# Altium footprint library 常用连接件.PcbLib: 38 footprints (part 1 of 3)
Each footprint in its own frame and in the unit in brackets; x right, y up, seen from the top. Pads: shape width x height; smd on the part's side, far side on the other; paste and mask are expansions set on the pad; w line width, h text height; cw(c..) or ccw(c..) is an arc to the next point about the centre after c.
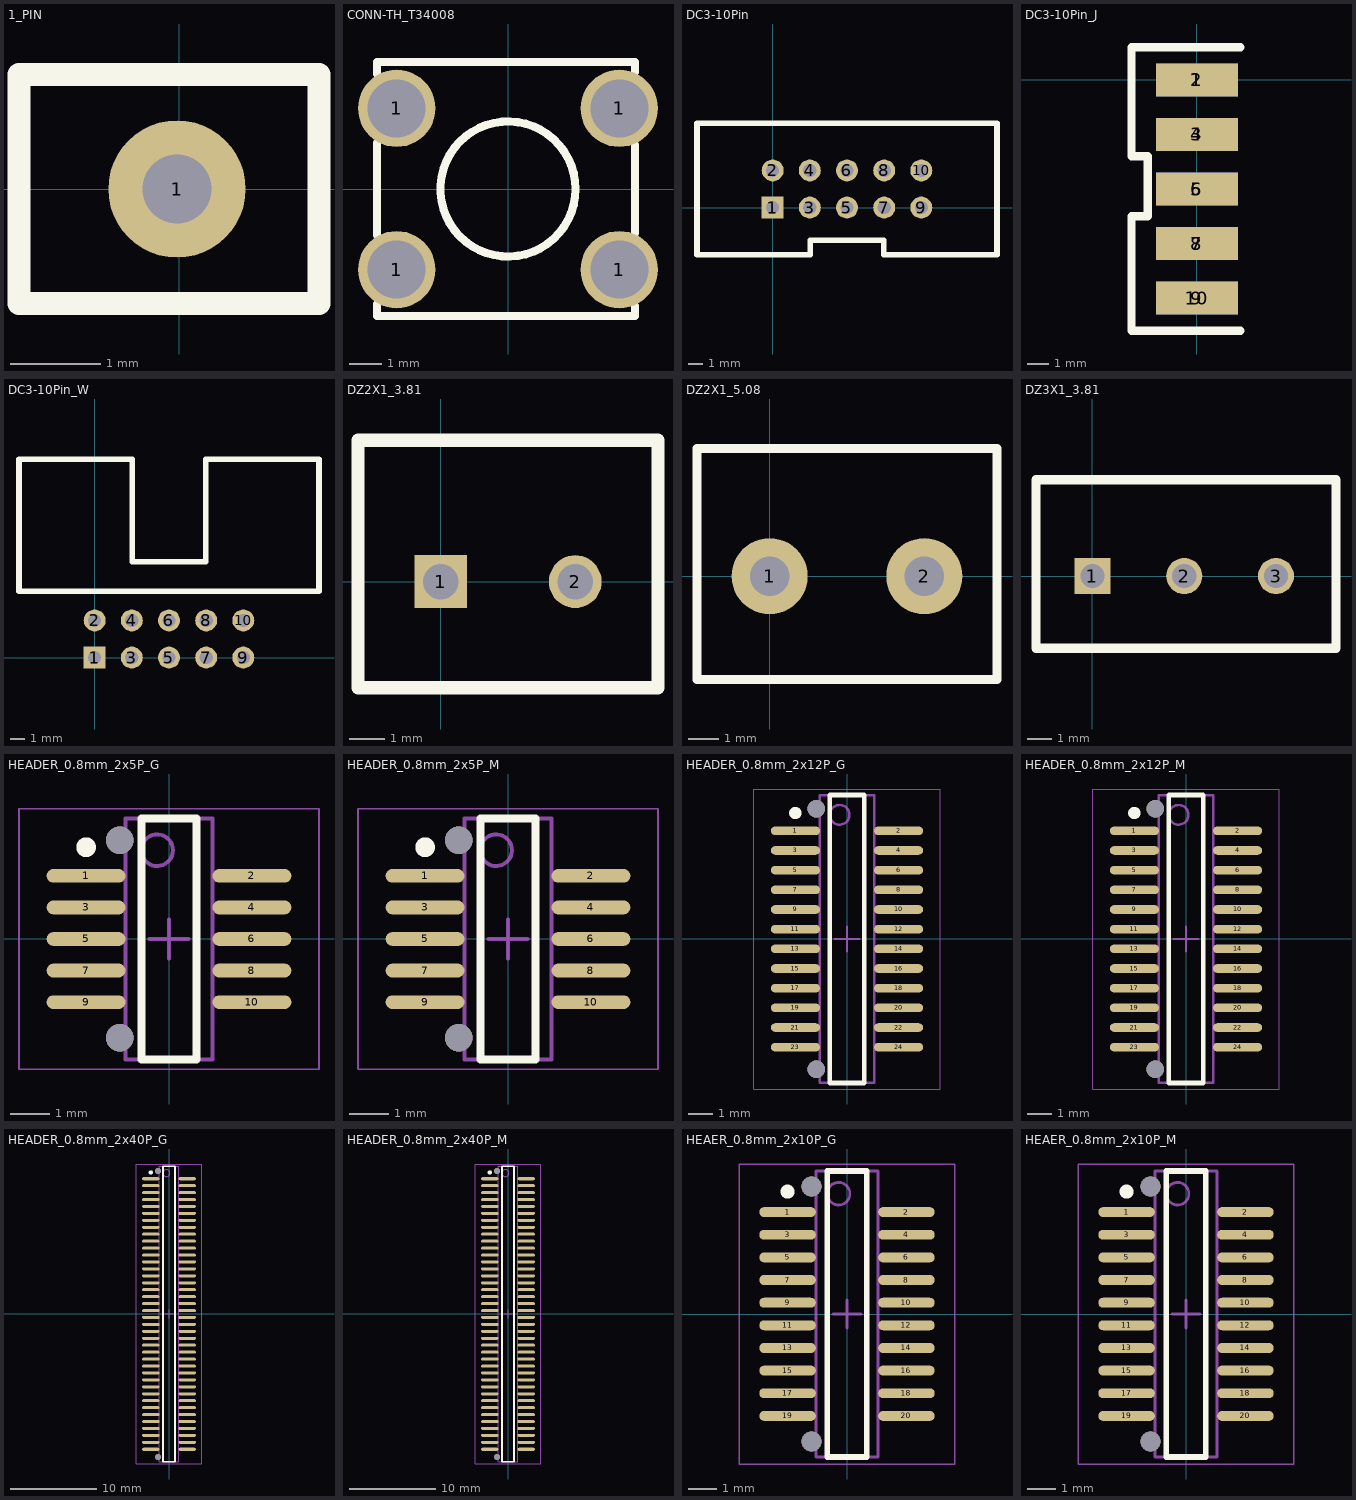
[diagram p0: the footprints below, top view; thin cyan lines are the x and y axes]

## 1_PIN [mil]
pads (1):
  round 60 hole 30: 1(-1,0)
Top Overlay:
  lines w10: -70,-50 -70,50 61,50 61,-50 -70,-50

## CONN-TH_T34008 [mm]
pads (4):
  round 2.4 hole 1.8: 1(-3.45,-2.5) 1(-3.45,2.5) 1(3.45,-2.5) 1(3.45,2.5)
Top Overlay:
  circle w0.254: c0,0 r2.094
  lines w0.254: -4.064,-3.567 -4.064,-3.937 3.937,-3.937 3.937,-3.63 ; -4.064,-1.433 -4.064,1.433 ; -4.064,3.567 -4.064,3.937 3.937,3.937 3.937,3.63 ; 3.937,-1.369 3.937,1.369
3D body "User Library-Ettinger-PN-13_42_322.step": height 8.04, standoff -4.93, extent -4.778,-7.588 4.778,3.912

## DC3-10Pin [mm] "简易牛角座DC3-10P，JTAG，ISP"
pads (10):
  rect 1.5x1.5 hole 0.9: 1(0,0)
  round 1.5 hole 0.9: 2(0,2.54) 3(2.54,0) 4(2.54,2.54) 5(5.08,0) 6(5.08,2.54) 7(7.62,0) 8(7.62,2.54) 9(10.16,0) 10(10.16,2.54)
Top Overlay:
  lines w0.381: 2.58,-3.23 -5.17,-3.23 -5.17,5.77 15.33,5.77 15.33,-3.23 7.58,-3.23 ; 2.58,-3.143 2.58,-2.23 7.58,-2.23 7.58,-3.19
3D body: height 8.5, standoff 0, extent -0.203,-0.356 0.229,0.356
3D body: height 8.5, standoff 0, extent 2.337,-0.356 2.769,0.356
3D body: height 8.5, standoff 0, extent 4.877,-0.356 5.309,0.356
3D body: height 8.5, standoff 0, extent 7.417,-0.356 7.849,0.356
3D body: height 8.5, standoff 0, extent 9.957,-0.356 10.389,0.356
3D body: height 8.5, standoff 0, extent 9.957,2.184 10.389,2.896
3D body: height 8.5, standoff 0, extent 7.417,2.184 7.849,2.896
3D body: height 8.5, standoff 0, extent 4.877,2.184 5.309,2.896
3D body: height 8.5, standoff 0, extent 2.337,2.184 2.769,2.896
3D body: height 8.5, standoff 0, extent -0.203,2.184 0.229,2.896
3D body: height 1, standoff 0, extent -5.17,-3.229 15.329,5.77
3D body: height 9, standoff 0, extent -5.17,-3.229 15.329,5.77

## DC3-10Pin_J [mil] "简易牛角座DC3-10P，夹着板子"
pads (10):
  rect 150x60 smd: 1(0,0) 3(0,-100) 5(0,-200) 7(0,-300) 9(0,-400)
  rect 150x60 smd far side: 2(0,0) 4(0,-100) 6(0,-200) 8(0,-300) 10(0,-400)
Top Overlay:
  lines w15: 80,-460 -120,-460 -120,-430 -120,-250 -90,-250 -90,-140 -120,-140 -120,30 -120,60 80,60

## DC3-10Pin_W [mm] "简易牛角座DC3-10P，JTAG，ISP 弯针"
pads (10):
  rect 1.5x1.5 hole 0.9: 1(0,0)
  round 1.5 hole 0.9: 2(0,2.54) 3(2.54,0) 4(2.54,2.54) 5(5.08,0) 6(5.08,2.54) 7(7.62,0) 8(7.62,2.54) 9(10.16,0) 10(10.16,2.54)
Top Overlay:
  lines w0.381: -5.17,4.54 15.33,4.54 15.33,13.54 7.58,13.54 7.58,6.54 2.58,6.54 2.58,13.54 -5.17,13.54 -5.17,4.54
3D body: height 9, standoff 0, extent -5.043,4.568 15.456,13.567

## DZ2X1_3.81 [mm] "3.81mm间距端子"
pads (2):
  rect 1.5x1.5 hole 1: 1(0,0)
  round 1.5 hole 1: 2(3.81,0)
Top Overlay:
  lines w0.381: -2.345,-3 -2.345,4 6.155,4 6.155,-3 -2.345,-3
3D body: height 9, standoff 0, extent -1.523,2.287 -0.763,2.793
3D body: height 9, standoff 0, extent 1.525,-2.285 2.285,3.301
3D body: height 9, standoff 0, extent 0.763,2.287 1.523,2.793
3D body: height 9, standoff 0, extent 4.573,2.287 5.333,2.793
3D body: height 9, standoff 0, extent 2.287,2.287 3.047,2.793
3D body: height 9, standoff 0, extent -2.344,-2.999 6.154,-2.287
3D body: height 9, standoff 0, extent -2.344,-2.285 -1.525,3.301
3D body: height 9, standoff 0, extent 5.335,-2.285 6.154,3.301
3D body: height 9, standoff 0, extent -2.344,3.303 6.154,3.999
3D body: height 2, standoff 0, extent -1.523,-2.285 5.333,3.301
3D body: height 8.2, standoff -2, extent -0.47,-0.356 0.47,0.356
3D body: height 8.2, standoff -2, extent 3.34,-0.356 4.28,0.356

## DZ2X1_5.08 [mm] "5.08mm间距端子"
pads (2):
  round 2.5 hole 1.3: 1(0,0) 2(5.08,0)
Top Overlay:
  lines w0.3: -2.388,-3.4 -2.388,4.2 7.468,4.2 7.468,-3.4 -2.388,-3.4
3D body "SW3dPS-CN_BT_1X2.STEP": height 10, standoff -2.28, extent -2.964,-3.712 7.536,3.988

## DZ3X1_3.81 [mm] "3.81mm间距端子"
pads (3):
  rect 1.5x1.5 hole 1: 1(0,0)
  round 1.5 hole 1: 2(3.81,0) 3(7.62,0)
Top Overlay:
  lines w0.381: -2.345,-3 10.109,-3 10.109,4 -2.345,4 -2.345,-3
3D body: height 8.2, standoff -2, extent 3.34,-0.356 4.28,0.356
3D body: height 8.2, standoff -2, extent -0.47,-0.356 0.47,0.356
3D body: height 2, standoff 0, extent -1.523,-2.285 9.145,3.301
3D body: height 9, standoff 0, extent -2.344,3.301 9.964,4.013
3D body: height 9, standoff 0, extent 5.335,-2.285 6.154,3.301
3D body: height 9, standoff 0, extent -2.344,-2.285 -1.525,3.301
3D body: height 9, standoff 0, extent -2.344,-2.997 9.964,-2.285
3D body: height 9, standoff 0, extent 2.287,2.287 3.047,2.793
3D body: height 9, standoff 0, extent 4.573,2.287 5.333,2.793
3D body: height 9, standoff 0, extent 0.763,2.287 1.523,2.793
3D body: height 9, standoff 0, extent 1.525,-2.285 2.285,3.301
3D body: height 9, standoff 0, extent -1.523,2.287 -0.763,2.793
3D body: height 9, standoff 0, extent 5.335,-2.285 6.095,3.301
3D body: height 9, standoff 0, extent 8.383,2.287 9.143,2.793
3D body: height 9, standoff 0, extent 6.097,2.287 6.857,2.793
3D body: height 9, standoff 0, extent 9.145,-2.285 9.964,3.301
3D body: height 8.2, standoff -2, extent 7.15,-0.356 8.09,0.356

## HEADER_0.8mm_2x5P_G [mm] "0.8间距2x5P公座，SMD"
height 2
pads (10):
  oval 2x0.35 smd: 1(-2.1,1.6) 2(2.1,1.6) 3(-2.1,0.8) 4(2.1,0.8) 5(-2.1,0) 6(2.1,0) 7(-2.1,-0.8) 8(2.1,-0.8) 9(-2.1,-1.6) 10(2.1,-1.6)
via -1.25,-2.5 diameter 0.7 hole 0.7
via -1.25,2.5 diameter 0.7 hole 0.7
Top Overlay:
  circle w0.25: c-2.1,2.325 r0.125
  lines w0.2: -0.7,-3.05 -0.7,3.05 0.7,3.05 0.7,-3.05 -0.7,-3.05
Mechanical 13:
  circle w0.1: c-0.3,2.25 r0.4
  lines w0.1: -1.1,-3.05 -1.1,3.05 1.1,3.05 1.1,-3.05 -1.1,-3.05
Mechanical 15:
  lines w0.05: -3.8,-3.3 -3.8,3.3 3.8,3.3 3.8,-3.3 -3.8,-3.3
  lines w0.1: -0.5,0 0.5,0 ; 0,-0.5 0,0.5
3D body "SG340-GxxP-B1-2x5.STEP": height 6, standoff -0.5, extent -2.48,-2.95 2.48,2.95

## HEADER_0.8mm_2x5P_M [mm] "0.8间距2x5P母座，SMD"
height 2
pads (10):
  oval 2x0.35 smd: 1(-2.1,1.6) 2(2.1,1.6) 3(-2.1,0.8) 4(2.1,0.8) 5(-2.1,0) 6(2.1,0) 7(-2.1,-0.8) 8(2.1,-0.8) 9(-2.1,-1.6) 10(2.1,-1.6)
via -1.25,-2.5 diameter 0.7 hole 0.7
via -1.25,2.5 diameter 0.7 hole 0.7
Top Overlay:
  circle w0.25: c-2.1,2.325 r0.125
  lines w0.2: -0.7,-3.05 -0.7,3.05 0.7,3.05 0.7,-3.05 -0.7,-3.05
Mechanical 13:
  circle w0.1: c-0.3,2.25 r0.4
  lines w0.1: -1.1,-3.05 -1.1,3.05 1.1,3.05 1.1,-3.05 -1.1,-3.05
Mechanical 15:
  lines w0.05: -3.8,-3.3 -3.8,3.3 3.8,3.3 3.8,-3.3 -3.8,-3.3
  lines w0.1: -0.5,0 0.5,0 ; 0,-0.5 0,0.5
3D body "SG340-GxxS-B1-2x5.STEP": height 4.1, standoff -0.5, extent -2.5,-2.963 2.5,2.937

## HEADER_0.8mm_2x12P_G [mm] "0.8间距2x12P公座，SMD"
height 2
pads (24):
  oval 2x0.35 smd: 1(-2.1,4.4) 2(2.1,4.4) 3(-2.1,3.6) 4(2.1,3.6) 5(-2.1,2.8) 6(2.1,2.8) 7(-2.1,2) 8(2.1,2) 9(-2.1,1.2) 10(2.1,1.2) 11(-2.1,0.4) 12(2.1,0.4) 13(-2.1,-0.4) 14(2.1,-0.4) 15(-2.1,-1.2) 16(2.1,-1.2) 17(-2.1,-2) 18(2.1,-2) 19(-2.1,-2.8) 20(2.1,-2.8) 21(-2.1,-3.6) 22(2.1,-3.6) 23(-2.1,-4.4) 24(2.1,-4.4)
via -1.25,-5.3 diameter 0.7 hole 0.7
via -1.25,5.3 diameter 0.7 hole 0.7
Top Overlay:
  circle w0.25: c-2.1,5.125 r0.125
  lines w0.2: -0.7,-5.85 0.7,-5.85 0.7,5.85 -0.7,5.85 -0.7,-5.85
Mechanical 13:
  circle w0.1: c-0.3,5.05 r0.4
  lines w0.1: -1.1,-5.85 1.1,-5.85 1.1,5.85 -1.1,5.85 -1.1,-5.85
Mechanical 15:
  lines w0.05: -3.8,-6.1 3.8,-6.1 3.8,6.1 -3.8,6.1 -3.8,-6.1
  lines w0.1: -0.5,0 0.5,0 ; 0,-0.5 0,0.5
3D body "SG340-GxxP-B1-2x12.STEP": height 5.9, standoff -0.6, extent -2.48,-5.75 2.48,5.75

## HEADER_0.8mm_2x12P_M [mm] "0.8间距2x12P公座，SMD"
height 2
pads (24):
  oval 2x0.35 smd: 1(-2.1,4.4) 2(2.1,4.4) 3(-2.1,3.6) 4(2.1,3.6) 5(-2.1,2.8) 6(2.1,2.8) 7(-2.1,2) 8(2.1,2) 9(-2.1,1.2) 10(2.1,1.2) 11(-2.1,0.4) 12(2.1,0.4) 13(-2.1,-0.4) 14(2.1,-0.4) 15(-2.1,-1.2) 16(2.1,-1.2) 17(-2.1,-2) 18(2.1,-2) 19(-2.1,-2.8) 20(2.1,-2.8) 21(-2.1,-3.6) 22(2.1,-3.6) 23(-2.1,-4.4) 24(2.1,-4.4)
via -1.25,5.3 diameter 0.7 hole 0.7
via -1.25,-5.3 diameter 0.7 hole 0.7
Top Overlay:
  circle w0.25: c-2.1,5.125 r0.125
  lines w0.2: -0.7,-5.85 -0.7,5.85 0.7,5.85 0.7,-5.85 -0.7,-5.85
Mechanical 13:
  circle w0.1: c-0.3,5.05 r0.4
  lines w0.1: -1.1,-5.85 -1.1,5.85 1.1,5.85 1.1,-5.85 -1.1,-5.85
Mechanical 15:
  lines w0.05: -3.8,-6.1 -3.8,6.1 3.8,6.1 3.8,-6.1 -3.8,-6.1
  lines w0.1: -0.5,0 0.5,0 ; 0,-0.5 0,0.5
3D body "SG340-GxxS-B1-2x12.STEP": height 4.1, standoff -0.5, extent -2.5,-5.75 2.5,5.75

## HEADER_0.8mm_2x40P_G [mm] "0.8间距2x40P公座，SMD"
height 2
pads (80):
  oval 2x0.35 smd: 1(-2.1,15.6) 2(2.1,15.6) 3(-2.1,14.8) 4(2.1,14.8) 5(-2.1,14) 6(2.1,14) 7(-2.1,13.2) 8(2.1,13.2) 9(-2.1,12.4) 10(2.1,12.4) 11(-2.1,11.6) 12(2.1,11.6) 13(-2.1,10.8) 14(2.1,10.8) 15(-2.1,10) 16(2.1,10) 17(-2.1,9.2) 18(2.1,9.2) 19(-2.1,8.4) 20(2.1,8.4) 21(-2.1,7.6) 22(2.1,7.6) 23(-2.1,6.8) 24(2.1,6.8) 25(-2.1,6) 26(2.1,6) 27(-2.1,5.2) 28(2.1,5.2) 29(-2.1,4.4) 30(2.1,4.4) 31(-2.1,3.6) 32(2.1,3.6) 33(-2.1,2.8) 34(2.1,2.8) 35(-2.1,2) 36(2.1,2) 37(-2.1,1.2) 38(2.1,1.2) 39(-2.1,0.4) 40(2.1,0.4) 41(-2.1,-0.4) 42(2.1,-0.4) 43(-2.1,-1.2) 44(2.1,-1.2) 45(-2.1,-2) 46(2.1,-2) 47(-2.1,-2.8) 48(2.1,-2.8) 49(-2.1,-3.6) 50(2.1,-3.6) 51(-2.1,-4.4) 52(2.1,-4.4) 53(-2.1,-5.2) 54(2.1,-5.2) 55(-2.1,-6) 56(2.1,-6) 57(-2.1,-6.8) 58(2.1,-6.8) 59(-2.1,-7.6) 60(2.1,-7.6) 61(-2.1,-8.4) 62(2.1,-8.4) 63(-2.1,-9.2) 64(2.1,-9.2) 65(-2.1,-10) 66(2.1,-10) 67(-2.1,-10.8) 68(2.1,-10.8) 69(-2.1,-11.6) 70(2.1,-11.6) 71(-2.1,-12.4) 72(2.1,-12.4) 73(-2.1,-13.2) 74(2.1,-13.2) 75(-2.1,-14) 76(2.1,-14) 77(-2.1,-14.8) 78(2.1,-14.8) 79(-2.1,-15.6) 80(2.1,-15.6)
via -1.25,16.5 diameter 0.7 hole 0.7
via -1.25,-16.5 diameter 0.7 hole 0.7
Top Overlay:
  circle w0.25: c-2.1,16.325 r0.125
  lines w0.2: -0.7,-17.05 -0.7,17.05 0.7,17.05 0.7,-17.05 -0.7,-17.05
Mechanical 13:
  circle w0.1: c-0.3,16.25 r0.4
  lines w0.1: -1.1,-17.05 -1.1,17.05 1.1,17.05 1.1,-17.05 -1.1,-17.05
Mechanical 15:
  lines w0.05: -3.8,-17.3 -3.8,17.3 3.8,17.3 3.8,-17.3 -3.8,-17.3
  lines w0.1: -0.5,0 0.5,0 ; 0,-0.5 0,0.5
3D body "SG340-GxxP-B1-2x40.STEP": height 6, standoff -0.5, extent -2.48,-16.95 2.48,16.95

## HEADER_0.8mm_2x40P_M [mm] "0.8间距2x40P公座，SMD"
height 2
pads (80):
  oval 2x0.35 smd: 1(-2.1,15.6) 2(2.1,15.6) 3(-2.1,14.8) 4(2.1,14.8) 5(-2.1,14) 6(2.1,14) 7(-2.1,13.2) 8(2.1,13.2) 9(-2.1,12.4) 10(2.1,12.4) 11(-2.1,11.6) 12(2.1,11.6) 13(-2.1,10.8) 14(2.1,10.8) 15(-2.1,10) 16(2.1,10) 17(-2.1,9.2) 18(2.1,9.2) 19(-2.1,8.4) 20(2.1,8.4) 21(-2.1,7.6) 22(2.1,7.6) 23(-2.1,6.8) 24(2.1,6.8) 25(-2.1,6) 26(2.1,6) 27(-2.1,5.2) 28(2.1,5.2) 29(-2.1,4.4) 30(2.1,4.4) 31(-2.1,3.6) 32(2.1,3.6) 33(-2.1,2.8) 34(2.1,2.8) 35(-2.1,2) 36(2.1,2) 37(-2.1,1.2) 38(2.1,1.2) 39(-2.1,0.4) 40(2.1,0.4) 41(-2.1,-0.4) 42(2.1,-0.4) 43(-2.1,-1.2) 44(2.1,-1.2) 45(-2.1,-2) 46(2.1,-2) 47(-2.1,-2.8) 48(2.1,-2.8) 49(-2.1,-3.6) 50(2.1,-3.6) 51(-2.1,-4.4) 52(2.1,-4.4) 53(-2.1,-5.2) 54(2.1,-5.2) 55(-2.1,-6) 56(2.1,-6) 57(-2.1,-6.8) 58(2.1,-6.8) 59(-2.1,-7.6) 60(2.1,-7.6) 61(-2.1,-8.4) 62(2.1,-8.4) 63(-2.1,-9.2) 64(2.1,-9.2) 65(-2.1,-10) 66(2.1,-10) 67(-2.1,-10.8) 68(2.1,-10.8) 69(-2.1,-11.6) 70(2.1,-11.6) 71(-2.1,-12.4) 72(2.1,-12.4) 73(-2.1,-13.2) 74(2.1,-13.2) 75(-2.1,-14) 76(2.1,-14) 77(-2.1,-14.8) 78(2.1,-14.8) 79(-2.1,-15.6) 80(2.1,-15.6)
via -1.25,-16.5 diameter 0.7 hole 0.7
via -1.25,16.5 diameter 0.7 hole 0.7
Top Overlay:
  circle w0.25: c-2.1,16.325 r0.125
  lines w0.2: -0.7,-17.05 0.7,-17.05 0.7,17.05 -0.7,17.05 -0.7,-17.05
Mechanical 13:
  circle w0.1: c-0.3,16.25 r0.4
  lines w0.1: -1.1,-17.05 1.1,-17.05 1.1,17.05 -1.1,17.05 -1.1,-17.05
Mechanical 15:
  lines w0.05: -3.8,-17.3 3.8,-17.3 3.8,17.3 -3.8,17.3 -3.8,-17.3
  lines w0.1: -0.5,0 0.5,0 ; 0,-0.5 0,0.5
3D body "SG340-GxxS-B1-2x40.STEP": height 4.1, standoff -0.5, extent -2.5,-16.95 2.5,16.95

## HEAER_0.8mm_2x10P_G [mm] "底座，20*2P,公座"
height 2
pads (20):
  oval 2x0.35 smd: 1(-2.1,3.6) 2(2.1,3.6) 3(-2.1,2.8) 4(2.1,2.8) 5(-2.1,2) 6(2.1,2) 7(-2.1,1.2) 8(2.1,1.2) 9(-2.1,0.4) 10(2.1,0.4) 11(-2.1,-0.4) 12(2.1,-0.4) 13(-2.1,-1.2) 14(2.1,-1.2) 15(-2.1,-2) 16(2.1,-2) 17(-2.1,-2.8) 18(2.1,-2.8) 19(-2.1,-3.6) 20(2.1,-3.6)
via -1.25,-4.5 diameter 0.7 hole 0.7
via -1.25,4.5 diameter 0.7 hole 0.7
Top Overlay:
  circle w0.25: c-2.1,4.325 r0.125
  lines w0.2: -0.7,-5.05 -0.7,5.05 0.7,5.05 0.7,-5.05 -0.7,-5.05
Mechanical 13:
  circle w0.1: c-0.3,4.25 r0.4
  lines w0.1: -1.1,-5.05 -1.1,5.05 1.1,5.05 1.1,-5.05 -1.1,-5.05
Mechanical 15:
  lines w0.05: -3.8,-5.3 -3.8,5.3 3.8,5.3 3.8,-5.3 -3.8,-5.3
  lines w0.1: -0.5,0 0.5,0 ; 0,-0.5 0,0.5
3D body "SG340-GxxP-B1-2x10.STEP": height 6, standoff -0.5, extent -2.505,-4.963 2.455,4.937

## HEAER_0.8mm_2x10P_M [mm] "底座，20*2P,公座"
height 2
pads (20):
  oval 2x0.35 smd: 1(-2.1,3.6) 2(2.1,3.6) 3(-2.1,2.8) 4(2.1,2.8) 5(-2.1,2) 6(2.1,2) 7(-2.1,1.2) 8(2.1,1.2) 9(-2.1,0.4) 10(2.1,0.4) 11(-2.1,-0.4) 12(2.1,-0.4) 13(-2.1,-1.2) 14(2.1,-1.2) 15(-2.1,-2) 16(2.1,-2) 17(-2.1,-2.8) 18(2.1,-2.8) 19(-2.1,-3.6) 20(2.1,-3.6)
via -1.25,-4.5 diameter 0.7 hole 0.7
via -1.25,4.5 diameter 0.7 hole 0.7
Top Overlay:
  circle w0.25: c-2.1,4.325 r0.125
  lines w0.2: -0.7,-5.05 -0.7,5.05 0.7,5.05 0.7,-5.05 -0.7,-5.05
Mechanical 13:
  circle w0.1: c-0.3,4.25 r0.4
  lines w0.1: -1.1,-5.05 -1.1,5.05 1.1,5.05 1.1,-5.05 -1.1,-5.05
Mechanical 15:
  lines w0.05: -3.8,-5.3 -3.8,5.3 3.8,5.3 3.8,-5.3 -3.8,-5.3
  lines w0.1: -0.5,0 0.5,0 ; 0,-0.5 0,0.5
3D body "SG340-GxxS-B1-2x10.STEP": height 4.1, standoff -0.5, extent -2.5,-4.95 2.5,4.95